# Altium integrated library CONNECTORS.IntLib: 163 symbols (continued)
## PLH-8 (continued)
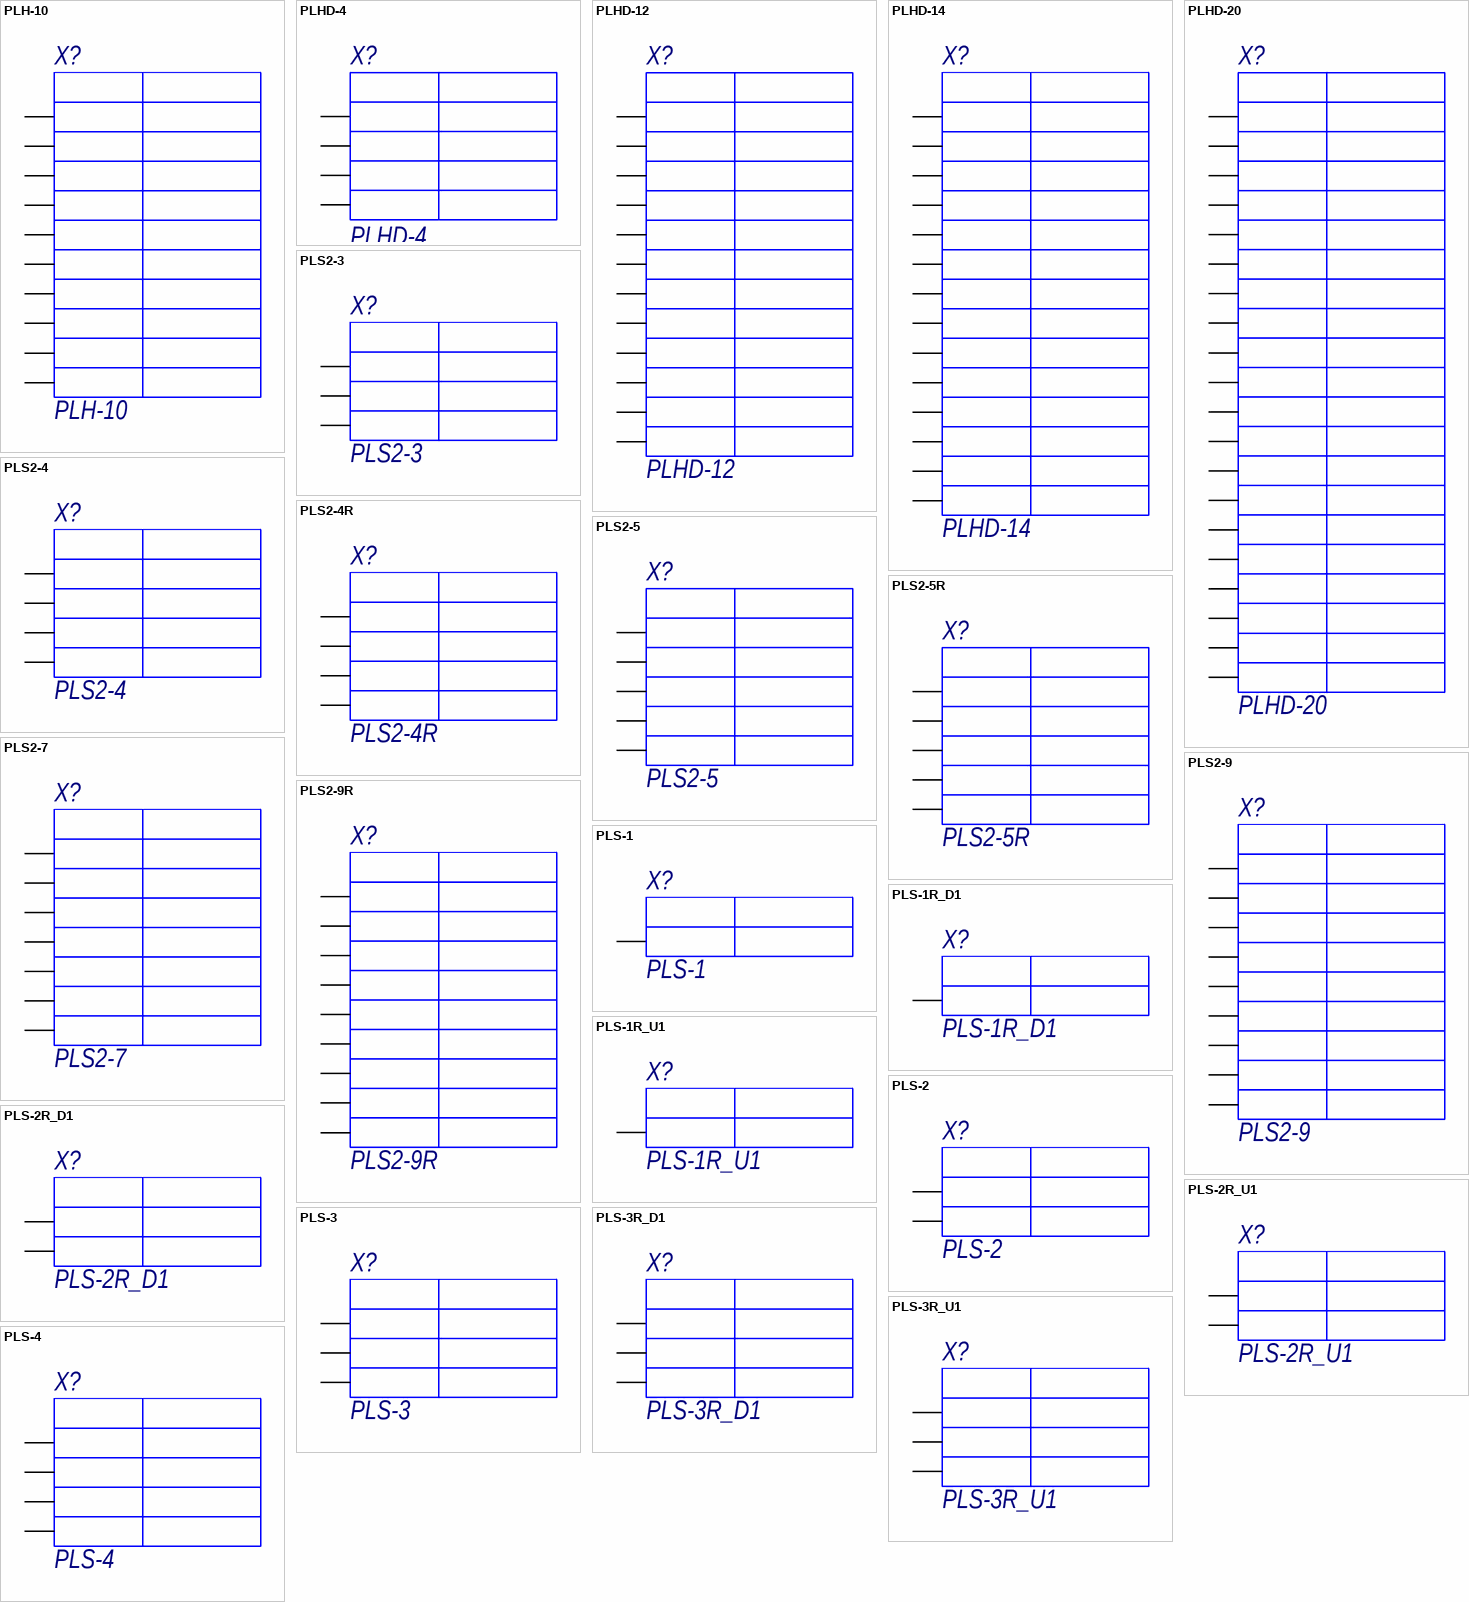
[diagram p4: symbols PLH-10 to PLS-4]

## PLH-10
designator X?
Разъём штыревой; ComponentDescription: Разъём штыревой, PLH-10; ComponentTypе: Разъём штыревой
footprint PLH-10
pins: 1, 2, 3, 4, 5, 6, 7, 8, 9, 10

## PLHD-4
designator X?
Разъём штыревой; ComponentDescription: Разъём штыревой, PLHD-4; ComponentTypе: Разъём штыревой
footprint PLHD-4
pins: 1, 2, 3, 4

## PLHD-12
designator X?
Разъём штыревой; ComponentDescription: Разъём штыревой, PLHD-12; ComponentTypе: Разъём штыревой
footprint PLHD-12
pins: 1, 2, 3, 4, 5, 6, 7, 8, 9, 10, 11, 12

## PLHD-14
designator X?
Разъём штыревой; ComponentDescription: Разъём штыревой, PLHD-14; ComponentTypе: Разъём штыревой
footprint PLHD-14
pins: 1, 2, 3, 4, 5, 6, 7, 8, 9, 10, 11, 12, 13, 14

## PLHD-20
designator X?
Разъём штыревой; ComponentDescription: Разъём штыревой, PLHD-20; ComponentTypе: Разъём штыревой
footprint PLHD-20
pins: 1, 2, 3, 4, 5, 6, 7, 8, 9, 10, 11, 12, 13, 14, 15, 16, 17, 18, 19, 20

## PLS2-3
designator X?
Разъём штыревой; ComponentDescription: Разъём штыревой, PLS2-3; ComponentTypе: Разъём штыревой
footprint PLS2-3 (Шаг 2мм)
pins: 1, 2, 3

## PLS2-4
designator X?
Разъём штыревой; ComponentDescription: Разъём штыревой, PLS2-4; ComponentTypе: Разъём штыревой
footprint PLS2-4 (Шаг 2мм)
pins: 1, 2, 3, 4

## PLS2-4R
designator X?
Разъём штыревой (угловой); ComponentDescription: Разъём штыревой (угловой), PLS2-4R; ComponentTypе: Разъём штыревой (угловой)
footprint PLS2-4R (Шаг 2мм)
pins: 1, 2, 3, 4

## PLS2-5
designator X?
Разъём штыревой; ComponentDescription: Разъём штыревой, PLS2-5; ComponentTypе: Разъём штыревой
footprint PLS2-5 (Шаг 2мм)
pins: 1, 2, 3, 4, 5

## PLS2-5R
designator X?
Разъём штыревой (угловой); ComponentDescription: Разъём штыревой (угловой), PLS2-5R; ComponentTypе: Разъём штыревой (угловой)
footprint PLS2-5R (Шаг 2мм)
pins: 1, 2, 3, 4, 5

## PLS2-7
designator X?
Разъём штыревой; ComponentDescription: Разъём штыревой, PLS2-7; ComponentTypе: Разъём штыревой
footprint PLS2-7 (Шаг 2мм)
pins: 1, 2, 3, 4, 5, 6, 7

## PLS2-9
designator X?
Разъём штыревой; ComponentDescription: Разъём штыревой, PLS2-9; ComponentTypе: Разъём штыревой
footprint PLS2-9 (Шаг 2мм)
pins: 1, 2, 3, 4, 5, 6, 7, 8, 9

## PLS2-9R
designator X?
Разъём штыревой (угловой); ComponentDescription: Разъём штыревой (угловой), PLS2-9R; ComponentTypе: Разъём штыревой (угловой)
footprint PLS2-9R (Шаг 2мм)
pins: 1, 2, 3, 4, 5, 6, 7, 8, 9

## PLS-1
designator X?
Разъём штыревой; ComponentDescription: Разъём штыревой, PLS-1; ComponentTypе: Разъём штыревой
footprint PLS-1
pins: 1

## PLS-1R_D1
designator X?
Разъём штыревой (угловой); ComponentDescription: Разъём штыревой, PLS-1R_D1; ComponentTypе: Разъём штыревой
footprint PLS-1R-D1
pins: 1

## PLS-1R_U1
designator X?
Разъём штыревой (угловой); ComponentDescription: Разъём штыревой, PLS-1R_U1; ComponentTypе: Разъём штыревой
footprint PLS-1R-U1
pins: 1

## PLS-2
designator X?
Разъём штыревой; ComponentDescription: Разъём штыревой, PLS-2; ComponentTypе: Разъём штыревой
footprint PLS-2
pins: 1, 2

## PLS-2R_D1
designator X?
Разъём штыревой (угловой); ComponentDescription: Разъём штыревой, PLS-2R_D1; ComponentTypе: Разъём штыревой
footprint PLS-2R-D1
pins: 1, 2

## PLS-2R_U1
designator X?
Разъём штыревой (угловой); ComponentDescription: Разъём штыревой, PLS-2R_U1; ComponentTypе: Разъём штыревой
footprint PLS-2R-U1
pins: 1, 2

## PLS-3
designator X?
Разъём штыревой; ComponentDescription: Разъём штыревой, PLS-3; ComponentTypе: Разъём штыревой
footprint PLS-3
pins: 1, 2, 3

## PLS-3R_D1
designator X?
Разъём штыревой (угловой); ComponentDescription: Разъём штыревой, PLS-3R_D1; ComponentTypе: Разъём штыревой
footprint PLS-3R-D1
pins: 1, 2, 3

## PLS-3R_U1
designator X?
Разъём штыревой (угловой); ComponentDescription: Разъём штыревой, PLS-3R_U1; ComponentTypе: Разъём штыревой
footprint PLS-3R-U1
pins: 1, 2, 3

## PLS-4
designator X?
Разъём штыревой; ComponentDescription: Разъём штыревой, PLS-4; ComponentTypе: Разъём штыревой
footprint PLS-4
pins: 1, 2, 3, 4

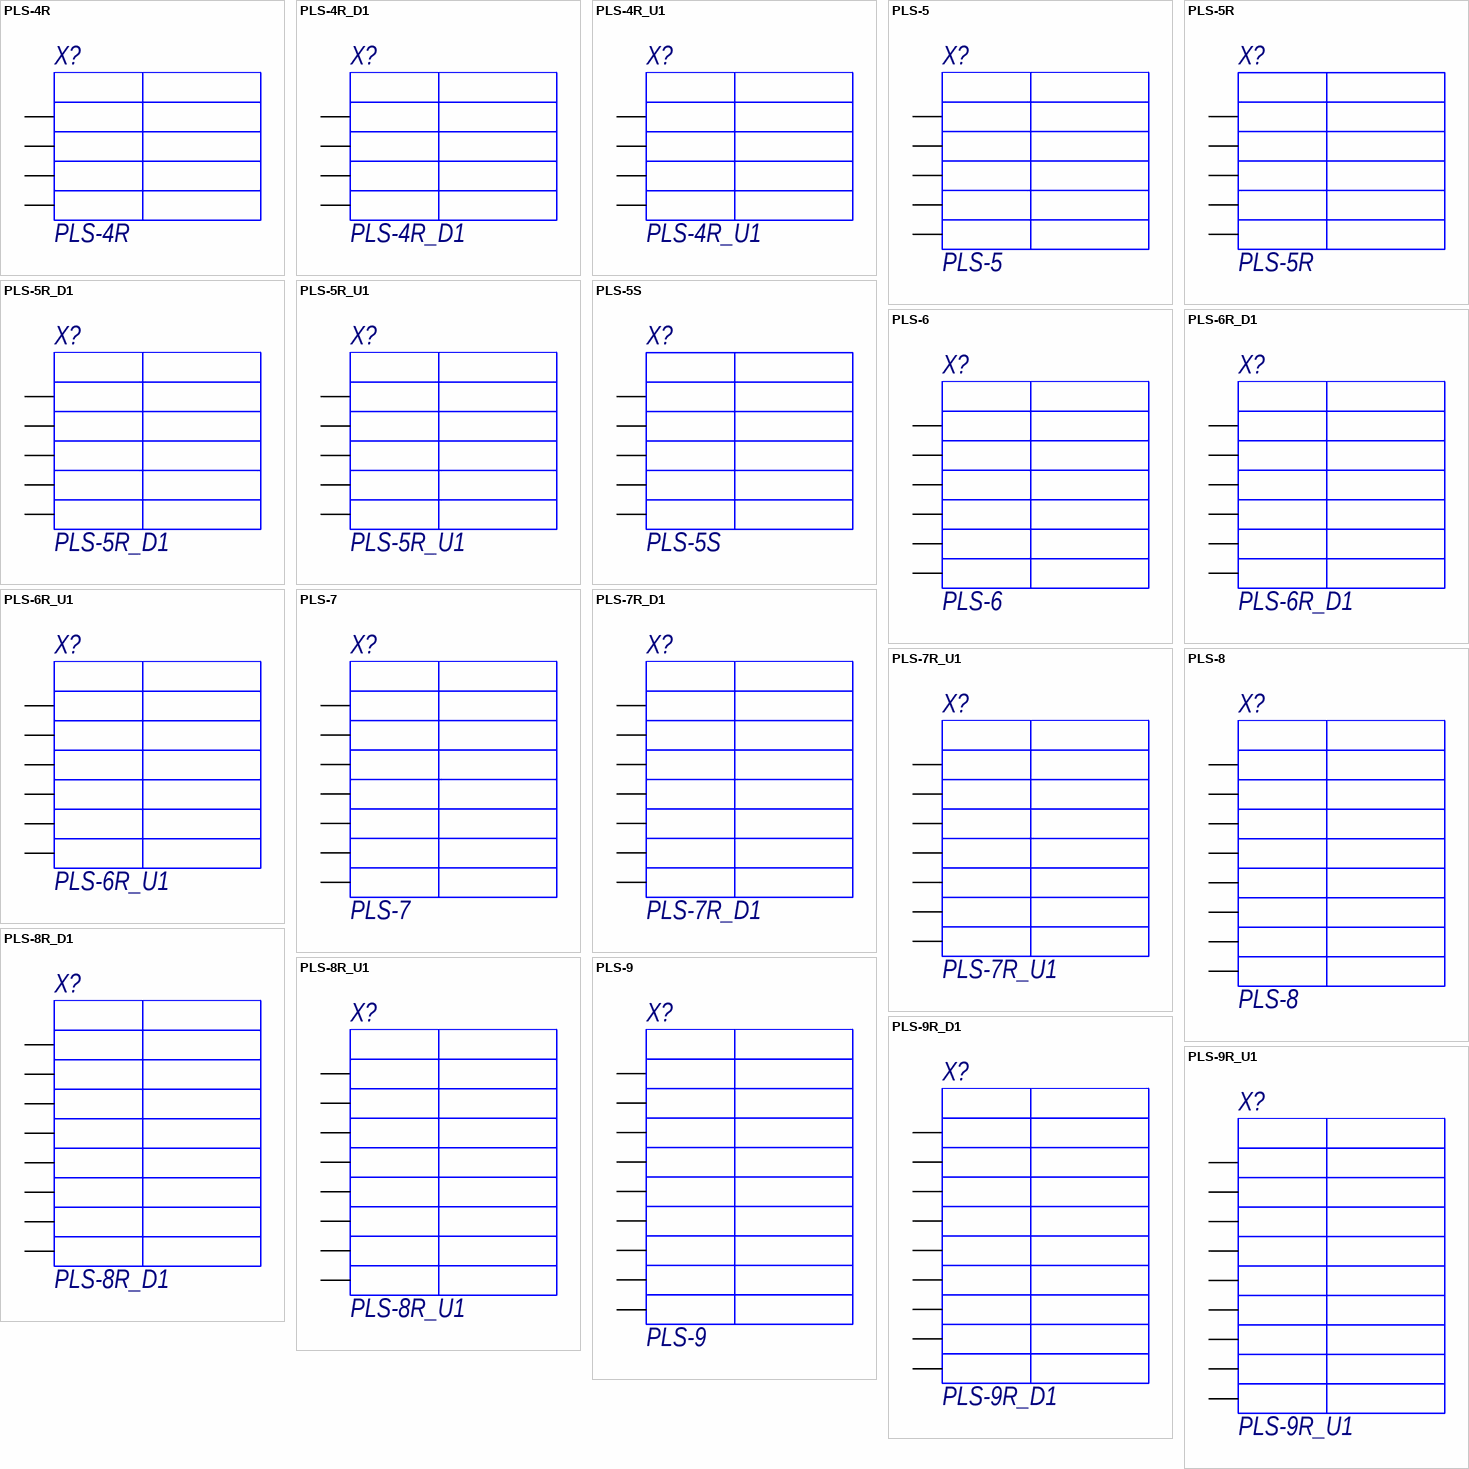
[diagram p5: symbols PLS-4R to PLS-9R_U1]

## PLS-4R
designator X?
Разъём штыревой (угловой); ComponentDescription: Разъём штыревой (угловой), PLS-4R; ComponentTypе: Разъём штыревой (угловой)
footprint PLS-4R
pins: 1, 2, 3, 4

## PLS-4R_D1
designator X?
Разъём штыревой (угловой); ComponentDescription: Разъём штыревой, PLS-4R_D1; ComponentTypе: Разъём штыревой
footprint PLS-4R-D1
pins: 1, 2, 3, 4

## PLS-4R_U1
designator X?
Разъём штыревой (угловой); ComponentDescription: Разъём штыревой, PLS-4R_U1; ComponentTypе: Разъём штыревой
footprint PLS-4R-U1
pins: 1, 2, 3, 4

## PLS-5
designator X?
Разъём штыревой; ComponentDescription: Разъём штыревой, PLS-5; ComponentTypе: Разъём штыревой
footprint PLS-5
pins: 1, 2, 3, 4, 5

## PLS-5R
designator X?
Разъём штыревой; ComponentDescription: Разъём штыревой, PLS-5R; ComponentTypе: Разъём штыревой
footprint PLS-5R
footprint PLS-5R(NO4PIN)
footprint PLS-5R(NO2PIN)
pins: 1, 2, 3, 4, 5

## PLS-5R_D1
designator X?
Разъём штыревой (угловой); ComponentDescription: Разъём штыревой, PLS-5R_D1; ComponentTypе: Разъём штыревой
footprint PLS-5R-D1
pins: 1, 2, 3, 4, 5

## PLS-5R_U1
designator X?
Разъём штыревой (угловой); ComponentDescription: Разъём штыревой, PLS-5R_U1; ComponentTypе: Разъём штыревой
footprint PLS-5R-U1
pins: 1, 2, 3, 4, 5

## PLS-5S
designator X?
Разъём штыревой (SMD); ComponentDescription: Разъём штыревой, PLS-5S; ComponentTypе: Разъём штыревой
footprint PLS-5S (Разъём PLS-5 (SMD))
pins: 1, 2, 3, 4, 5

## PLS-6
designator X?
Разъём штыревой; ComponentDescription: Разъём штыревой, PLS-6; ComponentTypе: Разъём штыревой
footprint PLS-6
pins: 1, 2, 3, 4, 5, 6

## PLS-6R_D1
designator X?
Разъём штыревой (угловой); ComponentDescription: Разъём штыревой, PLS-6R_D1; ComponentTypе: Разъём штыревой
footprint PLS-6R-D1
pins: 1, 2, 3, 4, 5, 6

## PLS-6R_U1
designator X?
Разъём штыревой (угловой); ComponentDescription: Разъём штыревой, PLS-6R_U1; ComponentTypе: Разъём штыревой
footprint PLS-6R-U1
pins: 1, 2, 3, 4, 5, 6

## PLS-7
designator X?
Разъём штыревой; ComponentDescription: Разъём штыревой, PLS-7; ComponentTypе: Разъём штыревой
footprint PLS-7
pins: 1, 2, 3, 4, 5, 6, 7

## PLS-7R_D1
designator X?
Разъём штыревой (угловой); ComponentDescription: Разъём штыревой, PLS-7R_D1; ComponentTypе: Разъём штыревой
footprint PLS-7R-D1
pins: 1, 2, 3, 4, 5, 6, 7

## PLS-7R_U1
designator X?
Разъём штыревой (угловой); ComponentDescription: Разъём штыревой, PLS-7R_U1; ComponentTypе: Разъём штыревой
footprint PLS-7R-U1
pins: 1, 2, 3, 4, 5, 6, 7

## PLS-8
designator X?
Разъём штыревой; ComponentDescription: Разъём штыревой, PLS-8; ComponentTypе: Разъём штыревой
footprint PLS-8
pins: 1, 2, 3, 4, 5, 6, 7, 8

## PLS-8R_D1
designator X?
Разъём штыревой (угловой); ComponentDescription: Разъём штыревой, PLS-8R_D1; ComponentTypе: Разъём штыревой
footprint PLS-8R-D1
pins: 1, 2, 3, 4, 5, 6, 7, 8

## PLS-8R_U1
designator X?
Разъём штыревой (угловой); ComponentDescription: Разъём штыревой, PLS-8R_U1; ComponentTypе: Разъём штыревой
footprint PLS-8R-U1
pins: 1, 2, 3, 4, 5, 6, 7, 8

## PLS-9
designator X?
Разъём штыревой; ComponentDescription: Разъём штыревой, PLS-9; ComponentTypе: Разъём штыревой
footprint PLS-9
pins: 1, 2, 3, 4, 5, 6, 7, 8, 9

## PLS-9R_D1
designator X?
Разъём штыревой (угловой); ComponentDescription: Разъём штыревой, PLS-9R_D1; ComponentTypе: Разъём штыревой
footprint PLS-9R-D1
pins: 1, 2, 3, 4, 5, 6, 7, 8, 9

## PLS-9R_U1
designator X?
Разъём штыревой (угловой); ComponentDescription: Разъём штыревой, PLS-9R_U1; ComponentTypе: Разъём штыревой
footprint PLS-9R-U1
pins: 1, 2, 3, 4, 5, 6, 7, 8, 9

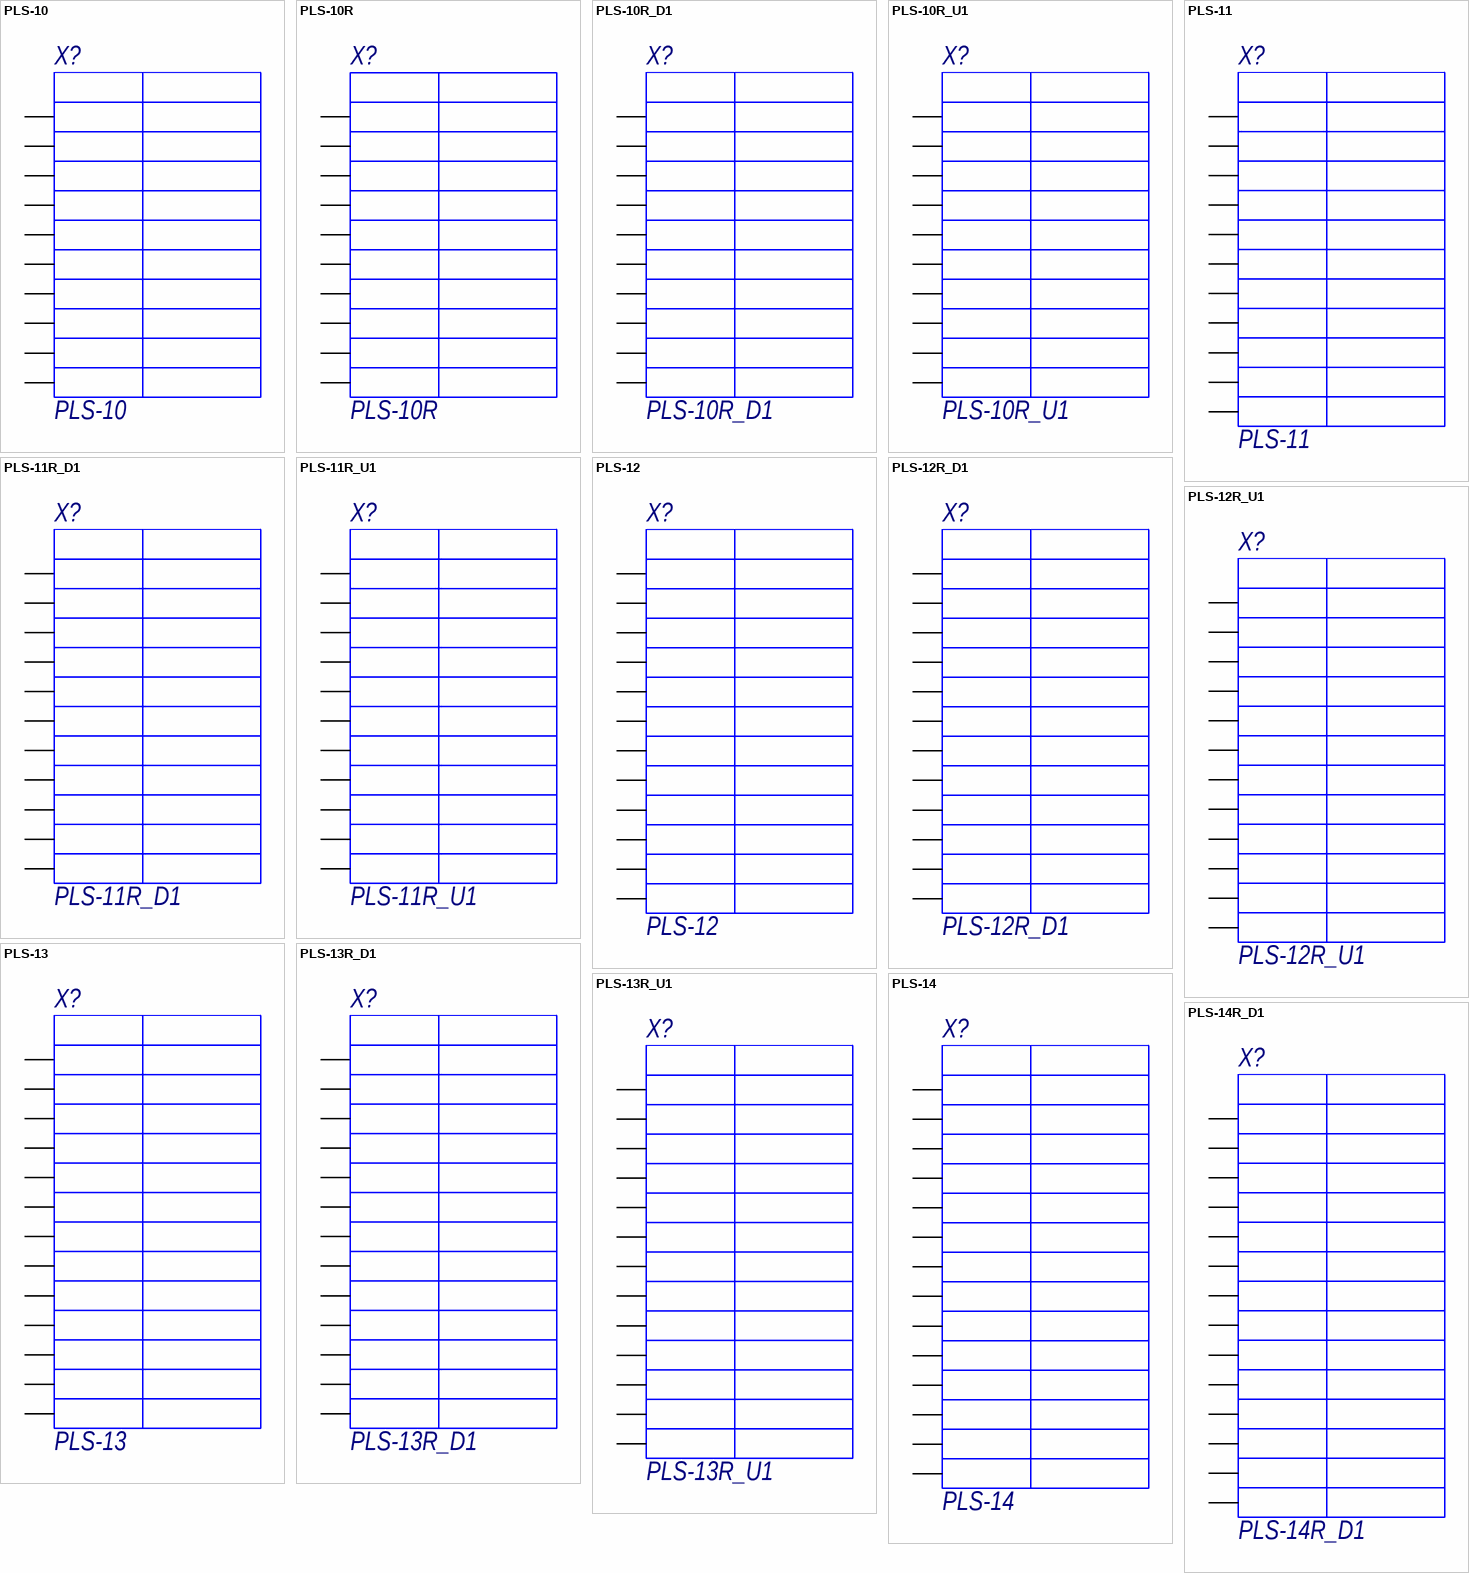
[diagram p6: symbols PLS-10 to PLS-14R_D1]

## PLS-10
designator X?
Разъём штыревой; ComponentDescription: Разъём штыревой, PLS-10; ComponentTypе: Разъём штыревой
footprint PLS-10
pins: 1, 2, 3, 4, 5, 6, 7, 8, 9, 10

## PLS-10R
designator X?
Разъём штыревой (угловой); ComponentDescription: Разъём штыревой (угловой), PLS-10R; ComponentTypе: Разъём штыревой (угловой)
footprint PLS-10R
pins: 1, 2, 3, 4, 5, 6, 7, 8, 9, 10

## PLS-10R_D1
designator X?
Разъём штыревой (угловой); ComponentDescription: Разъём штыревой, PLS-10R_D1; ComponentTypе: Разъём штыревой
footprint PLS-10R-D1
pins: 1, 2, 3, 4, 5, 6, 7, 8, 9, 10

## PLS-10R_U1
designator X?
Разъём штыревой (угловой); ComponentDescription: Разъём штыревой, PLS-10R_U1; ComponentTypе: Разъём штыревой
footprint PLS-10R-U1
pins: 1, 2, 3, 4, 5, 6, 7, 8, 9, 10

## PLS-11
designator X?
Разъём штыревой; ComponentDescription: Разъём штыревой, PLS-11; ComponentTypе: Разъём штыревой
footprint PLS-11
pins: 1, 2, 3, 4, 5, 6, 7, 8, 9, 10, 11

## PLS-11R_D1
designator X?
Разъём штыревой (угловой); ComponentDescription: Разъём штыревой, PLS-11R_D1; ComponentTypе: Разъём штыревой
footprint PLS-11R-D1
pins: 1, 2, 3, 4, 5, 6, 7, 8, 9, 10, 11

## PLS-11R_U1
designator X?
Разъём штыревой (угловой); ComponentDescription: Разъём штыревой, PLS-11R_U1; ComponentTypе: Разъём штыревой
footprint PLS-11R-U1
pins: 1, 2, 3, 4, 5, 6, 7, 8, 9, 10, 11

## PLS-12
designator X?
Разъём штыревой; ComponentDescription: Разъём штыревой, PLS-12; ComponentTypе: Разъём штыревой
footprint PLS-12
pins: 1, 2, 3, 4, 5, 6, 7, 8, 9, 10, 11, 12

## PLS-12R_D1
designator X?
Разъём штыревой (угловой); ComponentDescription: Разъём штыревой, PLS-12R_D1; ComponentTypе: Разъём штыревой
footprint PLS-12R-D1
pins: 1, 2, 3, 4, 5, 6, 7, 8, 9, 10, 11, 12

## PLS-12R_U1
designator X?
Разъём штыревой (угловой); ComponentDescription: Разъём штыревой, PLS-12R_U1; ComponentTypе: Разъём штыревой
footprint PLS-12R-U1
pins: 1, 2, 3, 4, 5, 6, 7, 8, 9, 10, 11, 12

## PLS-13
designator X?
Разъём штыревой; ComponentDescription: Разъём штыревой, PLS-13; ComponentTypе: Разъём штыревой
footprint PLS-13
pins: 1, 2, 3, 4, 5, 6, 7, 8, 9, 10, 11, 12, 13

## PLS-13R_D1
designator X?
Разъём штыревой (угловой); ComponentDescription: Разъём штыревой, PLS-13R_D1; ComponentTypе: Разъём штыревой
footprint PLS-13R-D1
pins: 1, 2, 3, 4, 5, 6, 7, 8, 9, 10, 11, 12, 13

## PLS-13R_U1
designator X?
Разъём штыревой (угловой); ComponentDescription: Разъём штыревой, PLS-13R_U1; ComponentTypе: Разъём штыревой
footprint PLS-13R-U1
pins: 1, 2, 3, 4, 5, 6, 7, 8, 9, 10, 11, 12, 13

## PLS-14
designator X?
Разъём штыревой; ComponentDescription: Разъём штыревой, PLS-14; ComponentTypе: Разъём штыревой
footprint PLS-14
pins: 1, 2, 3, 4, 5, 6, 7, 8, 9, 10, 11, 12, 13, 14

## PLS-14R_D1
designator X?
Разъём штыревой (угловой); ComponentDescription: Разъём штыревой, PLS-14R_D1; ComponentTypе: Разъём штыревой
footprint PLS-14R-D1
pins: 1, 2, 3, 4, 5, 6, 7, 8, 9, 10, 11, 12, 13, 14

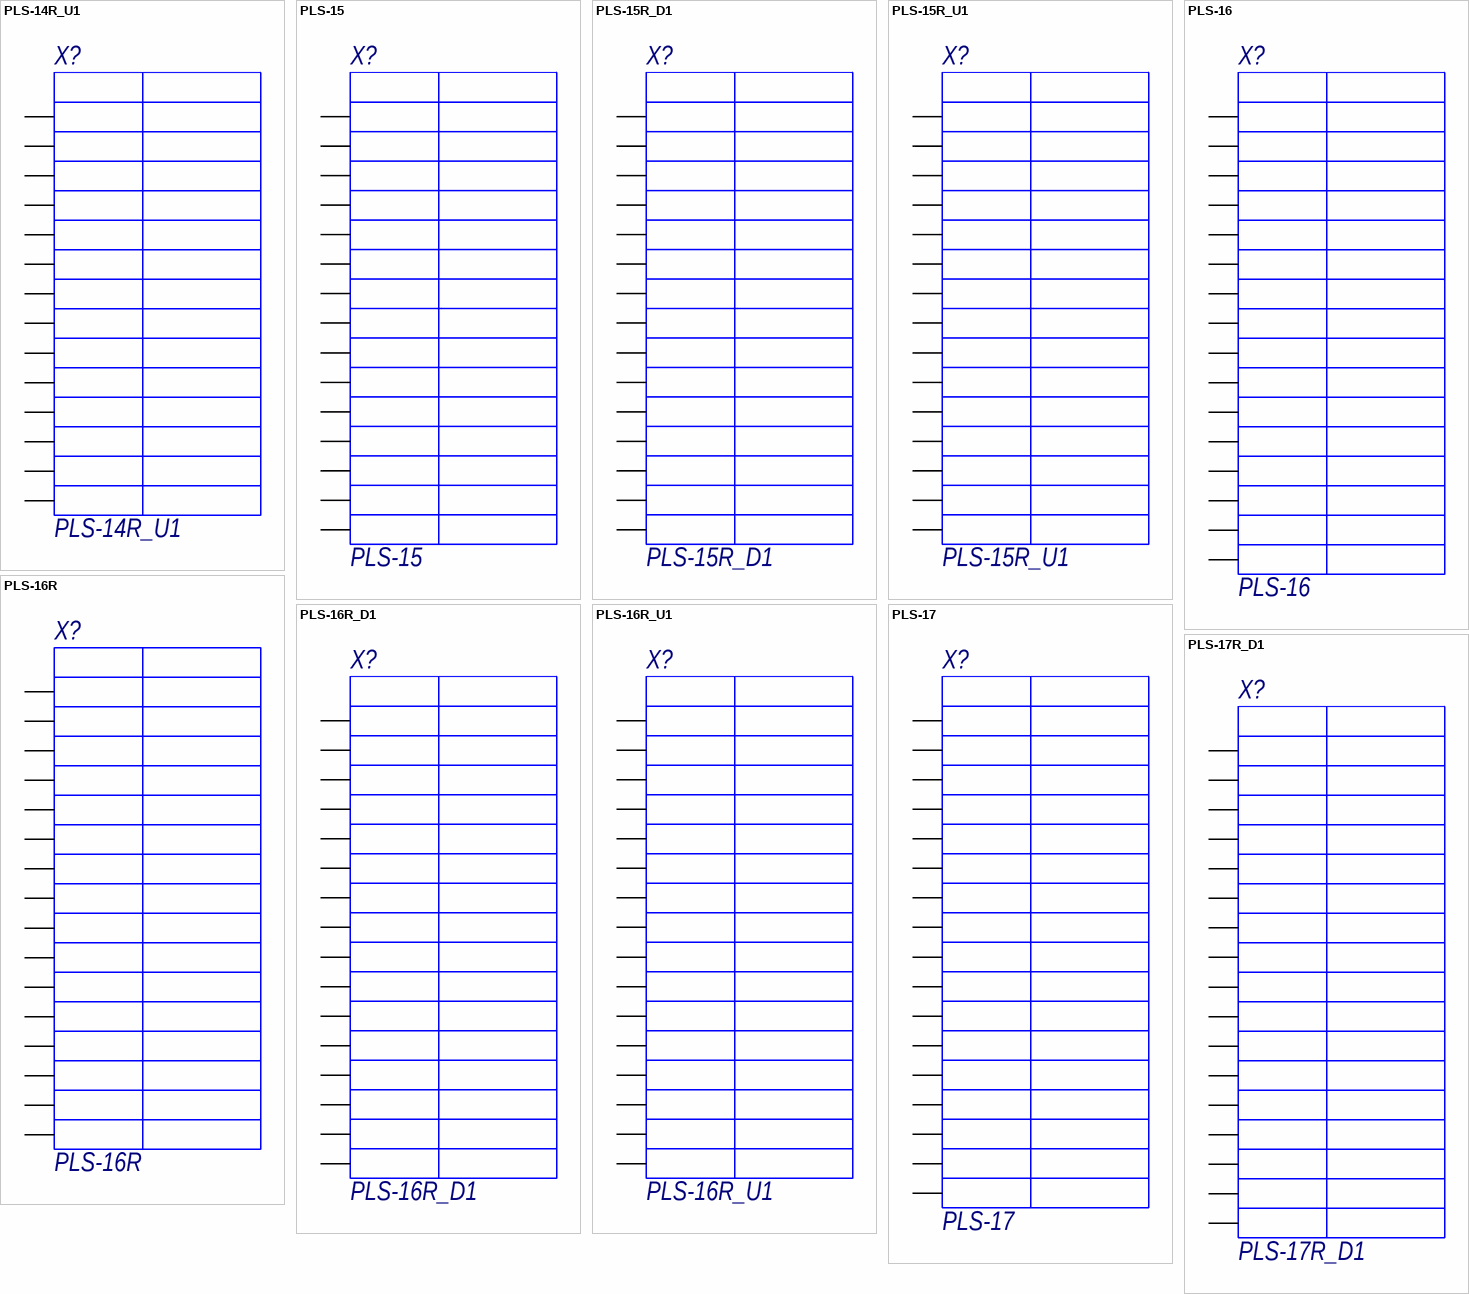
[diagram p7: symbols PLS-14R_U1 to PLS-17R_D1]

## PLS-14R_U1
designator X?
Разъём штыревой (угловой); ComponentDescription: Разъём штыревой, PLS-14R_U1; ComponentTypе: Разъём штыревой
footprint PLS-14R-U1
pins: 1, 2, 3, 4, 5, 6, 7, 8, 9, 10, 11, 12, 13, 14

## PLS-15
designator X?
Разъём штыревой; ComponentDescription: Разъём штыревой, PLS-15; ComponentTypе: Разъём штыревой
footprint PLS-15
pins: 1, 2, 3, 4, 5, 6, 7, 8, 9, 10, 11, 12, 13, 14, 15

## PLS-15R_D1
designator X?
Разъём штыревой (угловой); ComponentDescription: Разъём штыревой, PLS-15R_D1; ComponentTypе: Разъём штыревой
footprint PLS-15R-D1
pins: 1, 2, 3, 4, 5, 6, 7, 8, 9, 10, 11, 12, 13, 14, 15

## PLS-15R_U1
designator X?
Разъём штыревой (угловой); ComponentDescription: Разъём штыревой, PLS-15R_U1; ComponentTypе: Разъём штыревой
footprint PLS-15R-U1
pins: 1, 2, 3, 4, 5, 6, 7, 8, 9, 10, 11, 12, 13, 14, 15

## PLS-16
designator X?
Разъём штыревой; ComponentDescription: Разъём штыревой, PLS-16; ComponentTypе: Разъём штыревой
footprint PLS-16
pins: 1, 2, 3, 4, 5, 6, 7, 8, 9, 10, 11, 12, 13, 14, 15, 16

## PLS-16R
designator X?
Разъём штыревой (угловой); ComponentDescription: Разъём штыревой (угловой), PLS-16R; ComponentTypе: Разъём штыревой (угловой)
footprint PLS-16R
pins: 1, 2, 3, 4, 5, 6, 7, 8, 9, 10, 11, 12, 13, 14, 15, 16

## PLS-16R_D1
designator X?
Разъём штыревой (угловой); ComponentDescription: Разъём штыревой, PLS-16R_D1; ComponentTypе: Разъём штыревой
footprint PLS-16R-D1
pins: 1, 2, 3, 4, 5, 6, 7, 8, 9, 10, 11, 12, 13, 14, 15, 16

## PLS-16R_U1
designator X?
Разъём штыревой (угловой); ComponentDescription: Разъём штыревой, PLS-16R_U1; ComponentTypе: Разъём штыревой
footprint PLS-16R-U1
pins: 1, 2, 3, 4, 5, 6, 7, 8, 9, 10, 11, 12, 13, 14, 15, 16

## PLS-17
designator X?
Разъём штыревой; ComponentDescription: Разъём штыревой, PLS-17; ComponentTypе: Разъём штыревой
footprint PLS-17
pins: 1, 2, 3, 4, 5, 6, 7, 8, 9, 10, 11, 12, 13, 14, 15, 16, 17

## PLS-17R_D1
designator X?
Разъём штыревой (угловой); ComponentDescription: Разъём штыревой, PLS-17R_D1; ComponentTypе: Разъём штыревой
footprint PLS-17R-D1
pins: 1, 2, 3, 4, 5, 6, 7, 8, 9, 10, 11, 12, 13, 14, 15, 16, 17

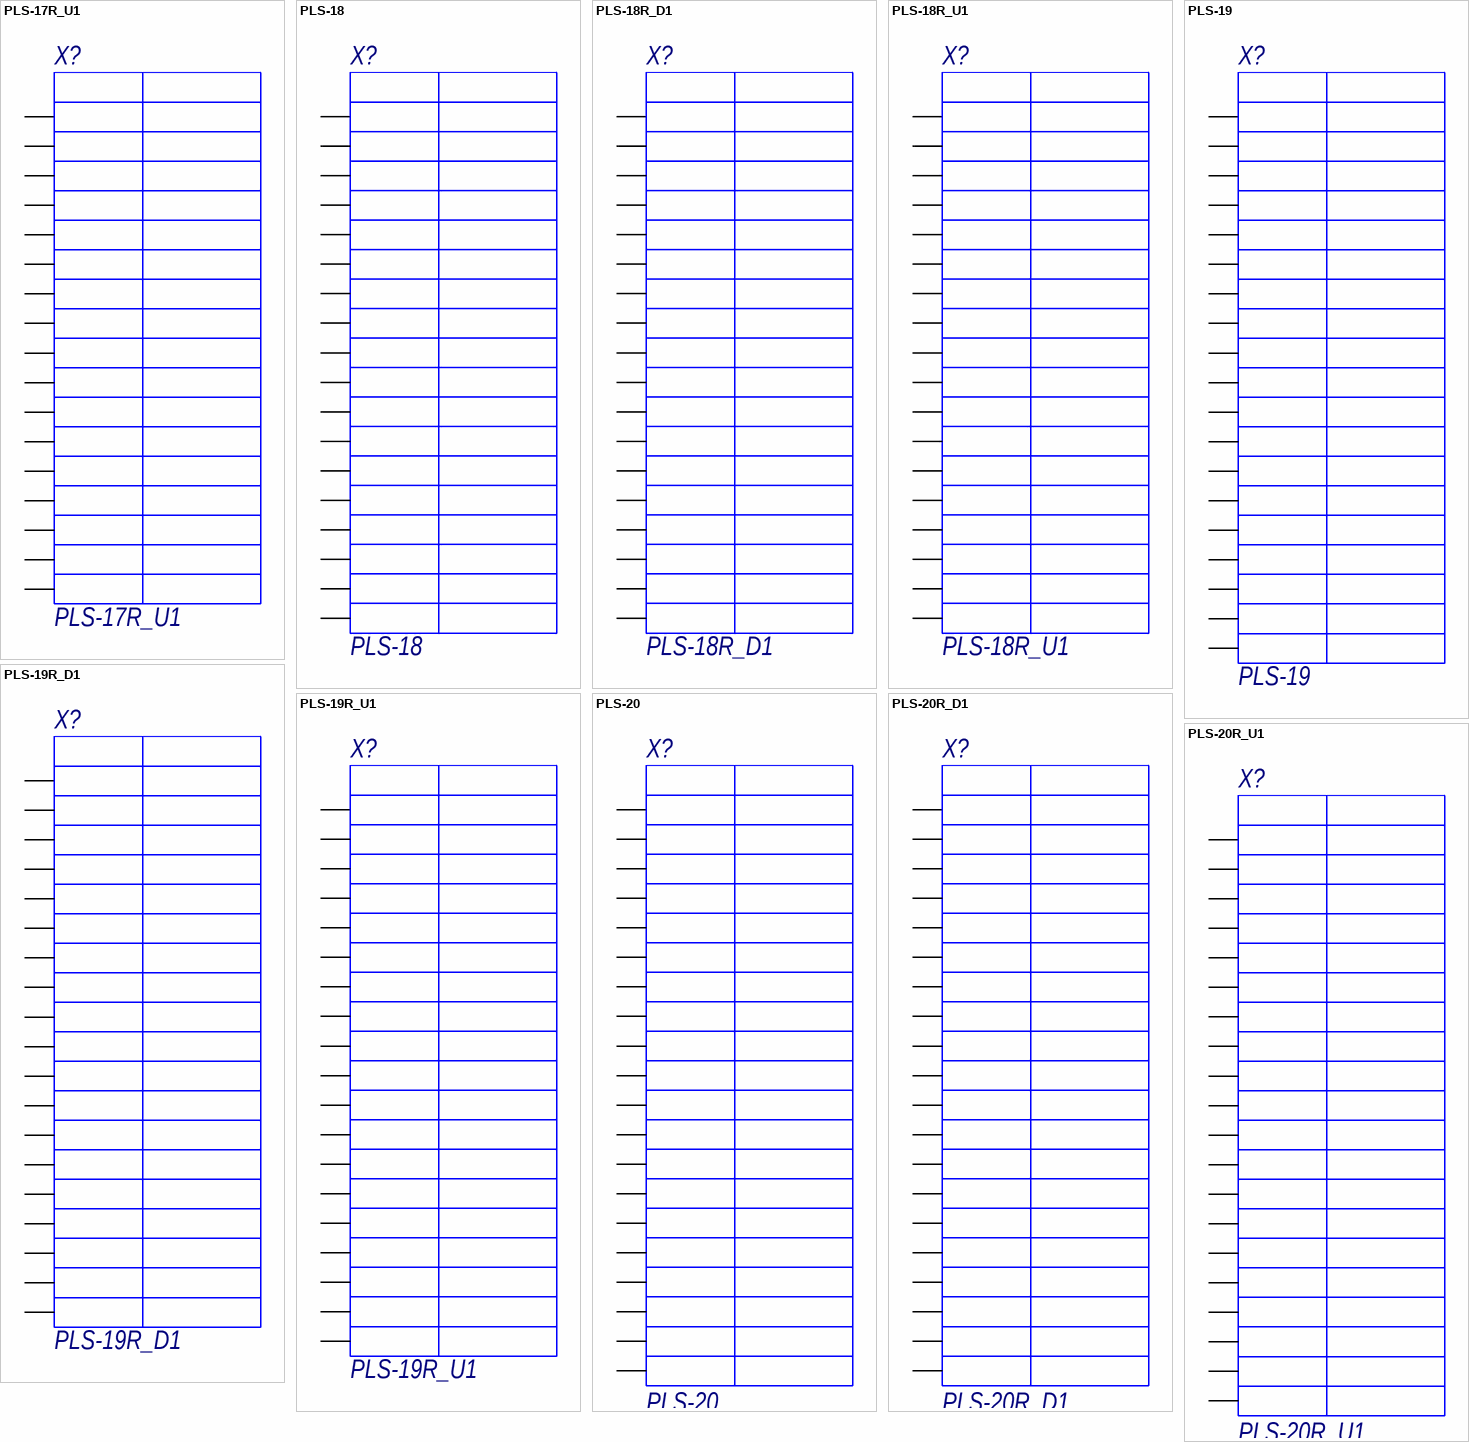
[diagram p8: symbols PLS-17R_U1 to PLS-20R_U1]

## PLS-17R_U1
designator X?
Разъём штыревой (угловой); ComponentDescription: Разъём штыревой, PLS-17R_U1; ComponentTypе: Разъём штыревой
footprint PLS-17R-U1
pins: 1, 2, 3, 4, 5, 6, 7, 8, 9, 10, 11, 12, 13, 14, 15, 16, 17

## PLS-18
designator X?
Разъём штыревой; ComponentDescription: Разъём штыревой, PLS-18; ComponentTypе: Разъём штыревой
footprint PLS-18
pins: 1, 2, 3, 4, 5, 6, 7, 8, 9, 10, 11, 12, 13, 14, 15, 16, 17, 18

## PLS-18R_D1
designator X?
Разъём штыревой (угловой); ComponentDescription: Разъём штыревой, PLS-18R_D1; ComponentTypе: Разъём штыревой
footprint PLS-18R-D1
pins: 1, 2, 3, 4, 5, 6, 7, 8, 9, 10, 11, 12, 13, 14, 15, 16, 17, 18

## PLS-18R_U1
designator X?
Разъём штыревой (угловой); ComponentDescription: Разъём штыревой, PLS-18R_U1; ComponentTypе: Разъём штыревой
footprint PLS-18R-U1
pins: 1, 2, 3, 4, 5, 6, 7, 8, 9, 10, 11, 12, 13, 14, 15, 16, 17, 18

## PLS-19
designator X?
Разъём штыревой; ComponentDescription: Разъём штыревой, PLS-19; ComponentTypе: Разъём штыревой
footprint PLS-19
pins: 1, 2, 3, 4, 5, 6, 7, 8, 9, 10, 11, 12, 13, 14, 15, 16, 17, 18, 19

## PLS-19R_D1
designator X?
Разъём штыревой (угловой); ComponentDescription: Разъём штыревой, PLS-19R_D1; ComponentTypе: Разъём штыревой
footprint PLS-19R-D1
pins: 1, 2, 3, 4, 5, 6, 7, 8, 9, 10, 11, 12, 13, 14, 15, 16, 17, 18, 19

## PLS-19R_U1
designator X?
Разъём штыревой (угловой); ComponentDescription: Разъём штыревой, PLS-19R_U1; ComponentTypе: Разъём штыревой
footprint PLS-19R-U1
pins: 1, 2, 3, 4, 5, 6, 7, 8, 9, 10, 11, 12, 13, 14, 15, 16, 17, 18, 19

## PLS-20
designator X?
Разъём штыревой; ComponentDescription: Разъём штыревой, PLS-20; ComponentTypе: Разъём штыревой
footprint PLS-20
pins: 1, 2, 3, 4, 5, 6, 7, 8, 9, 10, 11, 12, 13, 14, 15, 16, 17, 18, 19, 20

## PLS-20R_D1
designator X?
Разъём штыревой (угловой); ComponentDescription: Разъём штыревой, PLS-20R_D1; ComponentTypе: Разъём штыревой
footprint PLS-20R-D1
pins: 1, 2, 3, 4, 5, 6, 7, 8, 9, 10, 11, 12, 13, 14, 15, 16, 17, 18, 19, 20

## PLS-20R_U1
designator X?
Разъём штыревой (угловой); ComponentDescription: Разъём штыревой, PLS-20R_U1; ComponentTypе: Разъём штыревой
footprint PLS-20R-U1
pins: 1, 2, 3, 4, 5, 6, 7, 8, 9, 10, 11, 12, 13, 14, 15, 16, 17, 18, 19, 20

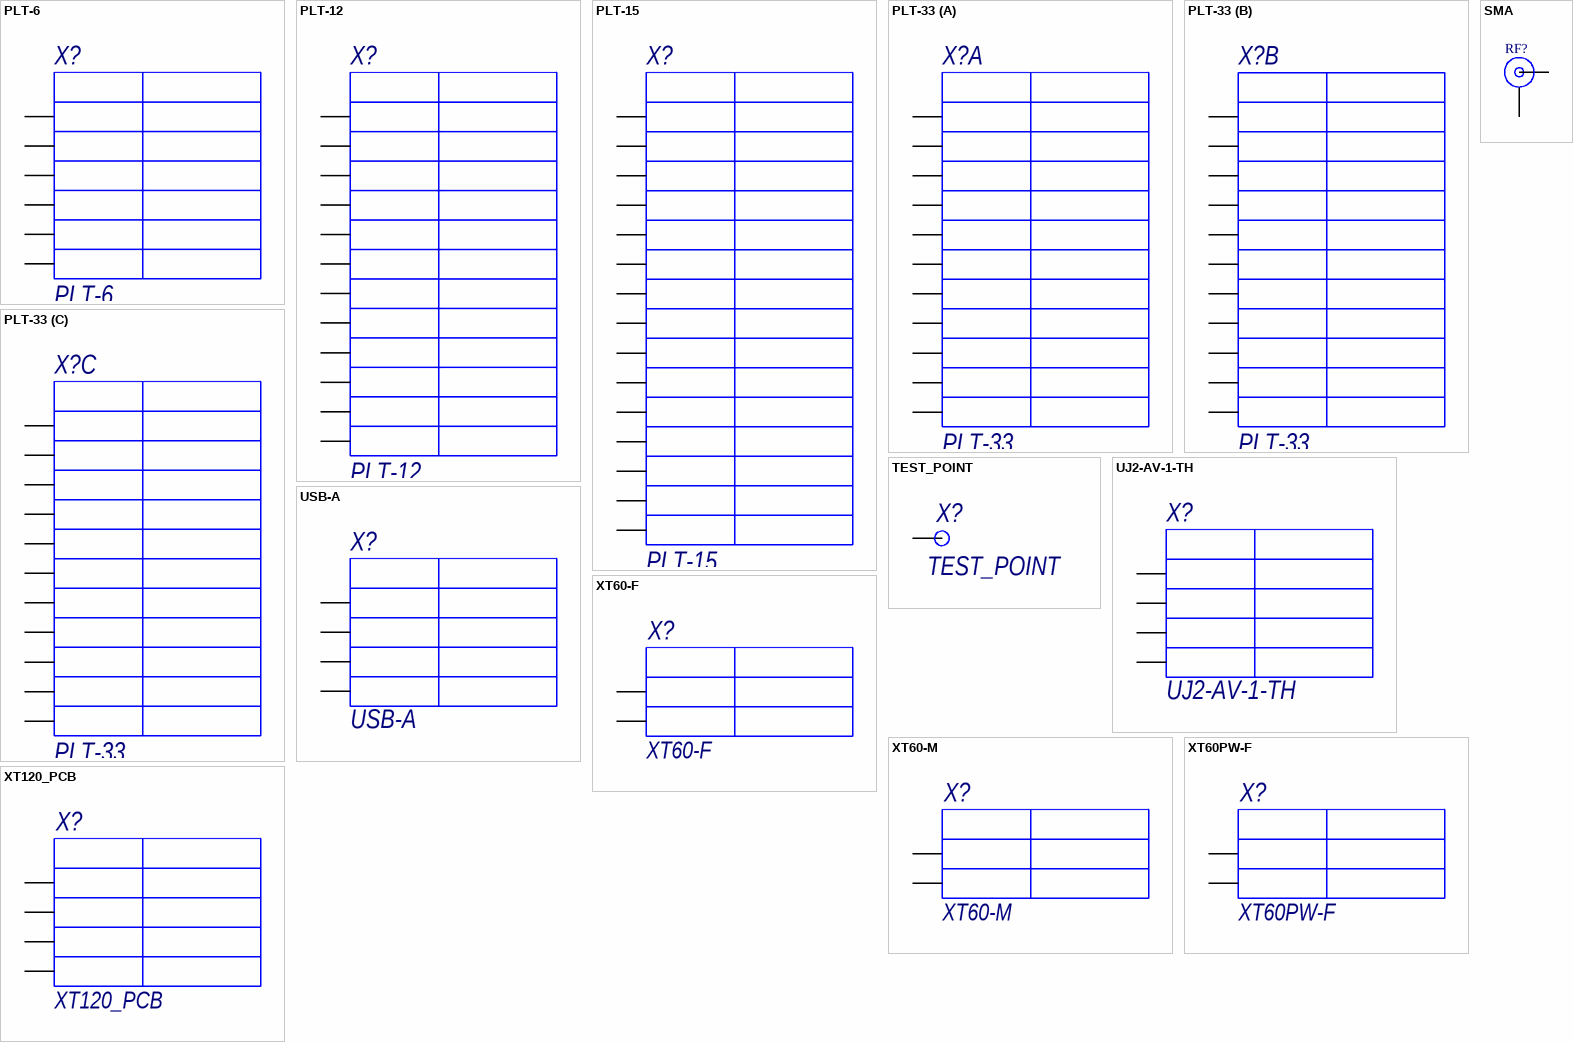
[diagram p9: symbols PLT-6 to XT120_PCB]

## PLT-6
designator X?
Разъём штыревой; ComponentDescription: Разъём штыревой, PLT-6; ComponentTypе: Разъём штыревой
footprint PLT-6
pins: 1, 2, 3, 4, 5, 6

## PLT-12
designator X?
Разъём штыревой; ComponentDescription: Разъём штыревой, PLT-12; ComponentTypе: Разъём штыревой
footprint PLT-12
pins: 1, 2, 3, 4, 5, 6, 7, 8, 9, 10, 11, 12

## PLT-15
designator X?
Разъём штыревой; ComponentDescription: Разъём штыревой, PLT-15; ComponentTypе: Разъём штыревой
footprint PLT-15
pins: 1, 2, 3, 4, 5, 6, 7, 8, 9, 10, 11, 12, 13, 14, 15

## PLT-33
designator X?
Разъём штыревой; ComponentDescription: Разъём штыревой, PLT-33; ComponentTypе: Разъём штыревой
footprint PLT-33
part A pins: 1, 2, 3, 4, 5, 6, 7, 8, 9, 10, 11
part B pins: 12, 13, 14, 15, 16, 17, 18, 19, 20, 21, 22
part C pins: 23, 24, 25, 26, 27, 28, 29, 30, 31, 32, 33

## SMA
designator RF?, comment Разъём SMA  (value not drawn)
Разъём антенный; PartNumber: 32K249-400L5; Design Note: Footprint in library is a generic example - only application specific footprint delivers High Performance; ComponentDescription: Разъём антенный, Разъём SMA; DatasheetVersion: b00; PackageVersion: b00; PackageReference: 32K249-400L5; PackageDescription: SMA Right Angle Jack, 14.8 x 6.35 x 9.7 mm; Mounting Technology: Through Hole; ComponentLink1Description: Manufacturer URL; ComponentLink1URL: http://www.rosenberger.de; ComponentLink2Description: Datasheet; ComponentLink2URL: http://rosenberger.de/ok/images/documents/db/32K249-400L5.pdf; ComponentLink3Description: Package Specification; ComponentLink3URL: http://rosenberger.de/ok/images/documents/db/32K249-400L5.pdf; ComponentLink4Description: Series Overview / Design Note; ComponentLink4URL: http://rosenberger.de/ok/images/documents/spez/32.pdf; ComponentLink5Description: Webshop / RFQ; ComponentLink5URL: http://www.rosenberger.com/en/contact/sales/; ComponentTypе: Разъём антенный
footprint ROS-32K249-400L5_V
footprint SMA-5-1814832-1 (SMA Straight Jack)
pins: 1, MH

## TEST_POINT
designator X?  (net tie, no BOM)
Тестовый контакт
footprint TEST_POINT (Контак на плате, диаметр 0.6 мм)
pins: 1

## UJ2-AV-1-TH
designator X?
Разъём USB (вертикальный); ComponentDescription: Разъём USB (вертикальный), UJ2-AV-1-TH; ComponentTypе: Разъём USB (вертикальный)
footprint USB-A-VERTICAL
pins: 1, 2, 3, 4

## USB-A
designator X?
Разъём USB; ComponentDescription: Разъём USB, USB-A; ComponentTypе: Разъём USB
footprint USB-A
pins: 1, 2, 3, 4

## XT60-F
designator X?
Разъем; ComponentDescription: Разъём, XT60-F; ComponentTypе: Разъём
footprint XT60-F AMASS (Вилка; питания DC; XT60; "мама"; PIN: 2; на провод; под пайку; 30А)
pins: 1, 2

## XT60-M
designator X?
Разъем; ComponentDescription: Разъём, XT60-M; ComponentTypе: Разъём
footprint XT60-M AMASS (Вилка; питания DC; XT60; "папа"; PIN: 2; на провод; под пайку; 30А)
pins: 1, 2

## XT60PW-F
designator X?
Разъем; ComponentDescription: Разъём, XT60PW-F; ComponentTypе: Разъём
footprint XT60PW-F AMASS (Гнездо; питания DC; XT60; "мама"; PIN: 2; на PCB; THT; Цвет: желтый)
pins: 1, 2

## XT120_PCB
designator X?
Разъем; ComponentDescription: Разъём, XT120_PCB; ComponentTypе: Разъём
footprint XT120_PCB
pins: 1, 2, 3, 4